# Altium footprint library Connectors.PcbLib: 117 footprints (part 5 of 8)
Each footprint in its own frame and in the unit in brackets; x right, y up, seen from the top. Pads: shape width x height; smd on the part's side, far side on the other; paste and mask are expansions set on the pad; w line width, h text height; cw(c..) or ccw(c..) is an arc to the next point about the centre after c.
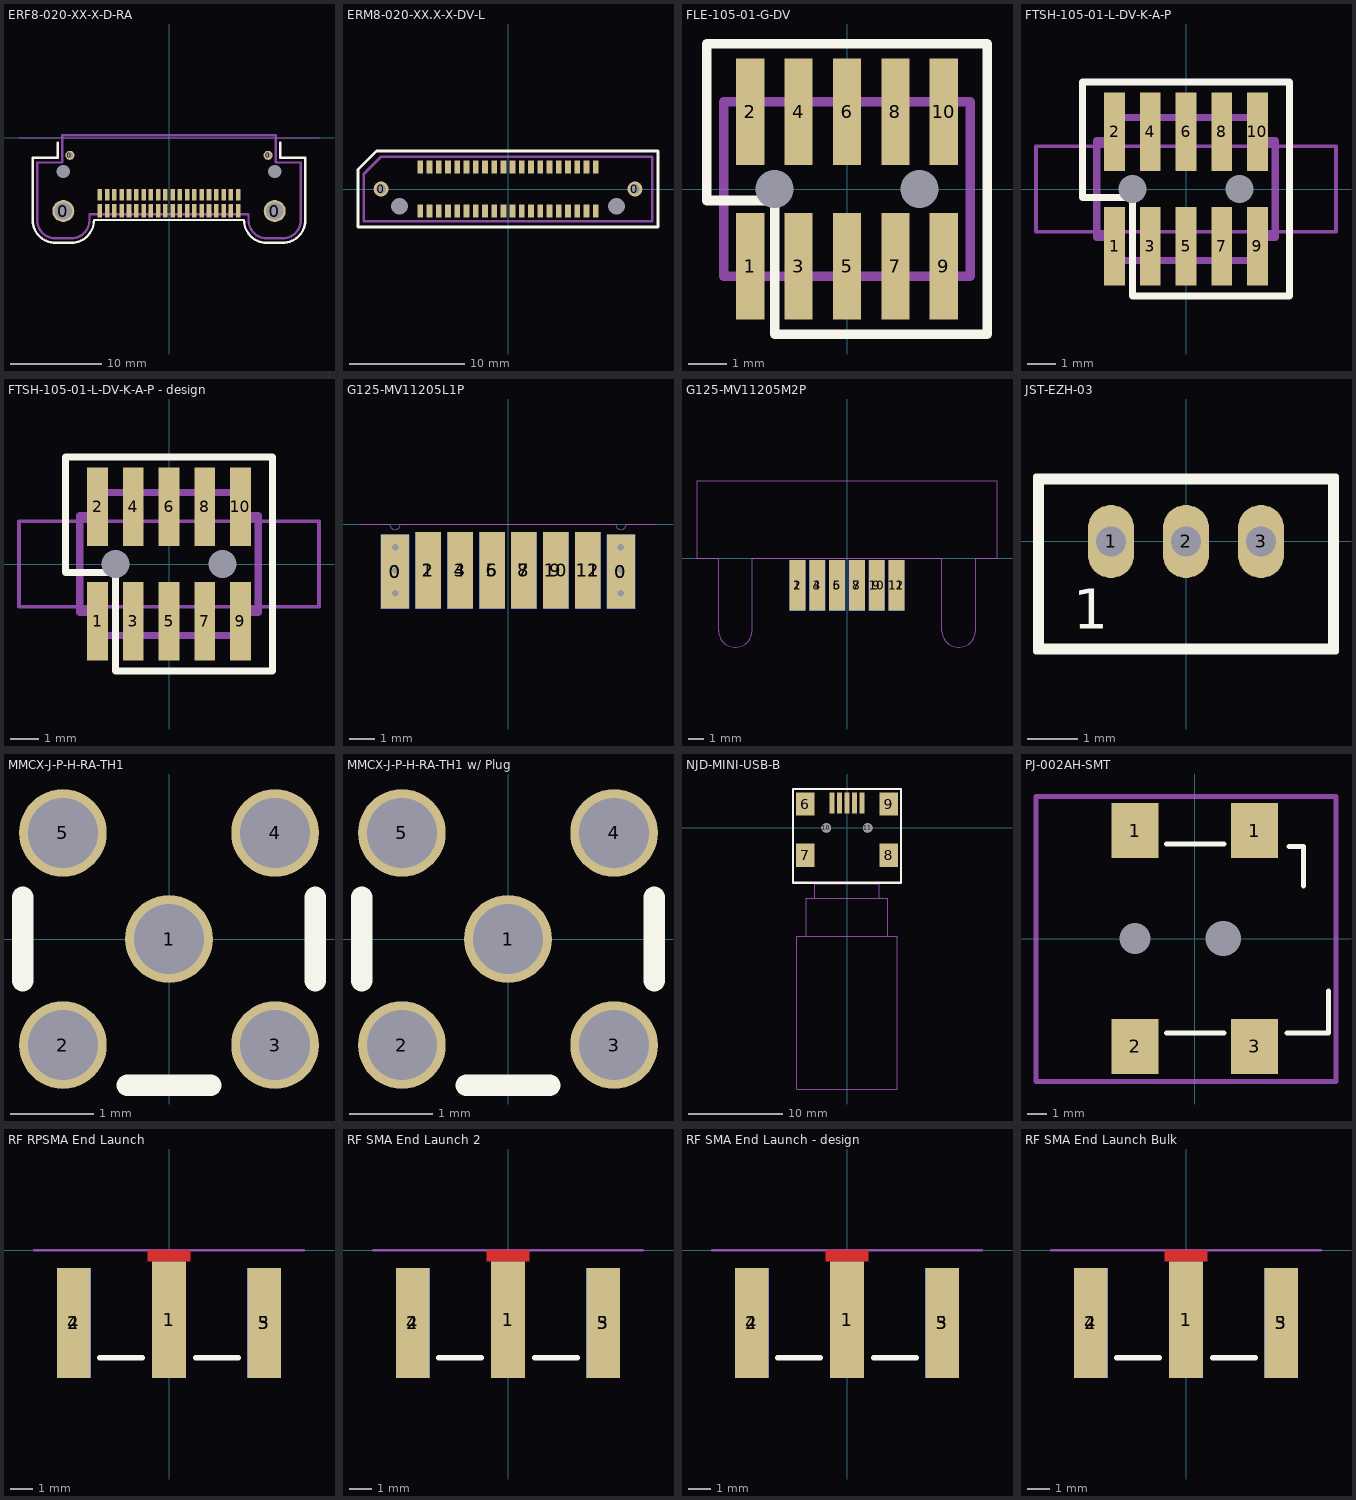
[diagram p4: the footprints below, top view; thin cyan lines are the x and y axes]

## ERF8-020-XX-X-D-RA [mm]
pads (46):
  round 2.41 hole 1.905 mask+0.075: 0(-11.625,-8.05) 0(11.625,-8.05)
  round 1 hole 0.63 mask+0.075: 0(-10.9,-1.92) 0(10.9,-1.92)
  rect 0.5x1.25 smd mask+0.05: 1(7.6,-6.275) 3(6.8,-6.275) 5(6,-6.275) 7(5.2,-6.275) 9(4.4,-6.275) 11(3.6,-6.275) 13(2.8,-6.275) 15(2,-6.275) 17(1.2,-6.275) 19(0.4,-6.275) 21(-0.4,-6.275) 23(-1.2,-6.275) 25(-2,-6.275) 27(-2.8,-6.275) 29(-3.6,-6.275) 31(-4.4,-6.275) 33(-5.2,-6.275) 35(-6,-6.275) 37(-6.8,-6.275) 39(-7.6,-6.275)
  rect 0.5x1.5 smd mask+0.05: 2(7.6,-8.03) 4(6.8,-8.03) 6(6,-8.03) 8(5.2,-8.03) 10(4.4,-8.03) 12(3.6,-8.03) 14(2.8,-8.03) 16(2,-8.03) 18(1.2,-8.03) 20(0.4,-8.03) 22(-0.4,-8.03) 24(-1.2,-8.03) 26(-2,-8.03) 28(-2.8,-8.03) 30(-3.6,-8.03) 32(-4.4,-8.03) 34(-5.2,-8.03) 36(-6,-8.03) 38(-6.8,-8.03) 40(-7.6,-8.03)
  round 0 hole 1.45 unplated: MH1(11.625,-3.7) MH2(-11.625,-3.7)
Top Overlay:
  lines w0.254: -12.25,-0.5 -12.25,-2.2 -15,-2.2 -15,-9.05 ccw(c-12.5,-9.05) -12.5,-11.55 -10.75,-11.55 ; -10.751,-11.55 ccw(c-10.76,-9.04) -8.25,-9.031 ; -8.25,-9.03 8.25,-9.03 ; 8.25,-9.031 ccw(c10.76,-9.04) 10.751,-11.55 ; 10.75,-11.55 12.5,-11.55 ccw(c12.5,-9.05) 15,-9.05 15,-2.2 12.25,-2.2 12.25,-0.5
Mechanical 1:
  lines w0.178: -6.8,-8.4 -6.8,-7.65 ; -6,-8.4 -6,-7.65 ; -5.2,-8.4 -5.2,-7.65 ; -4.4,-8.4 -4.4,-7.65 ; -3.6,-8.4 -3.6,-7.65 ; -2.8,-8.4 -2.8,-7.65 ; -2,-8.4 -2,-7.65 ; -1.2,-8.4 -1.2,-7.65 ; -0.4,-8.4 -0.4,-7.65 ; 0.4,-8.4 0.4,-7.65 ; 1.2,-8.4 1.2,-7.65 ; 2,-8.4 2,-7.65 ; 2.8,-8.4 2.8,-7.65 ; 3.6,-8.4 3.6,-7.65 ; 4.4,-8.4 4.4,-7.65 ; 5.2,-8.4 5.2,-7.65 ; 6,-8.4 6,-7.65 ; 6.8,-8.4 6.8,-7.65 ; -7.6,-8.4 -7.6,-7.65 -7.6,-8.4 ; 7.6,-8.4 7.6,-7.65 7.6,-8.4
  lines w0.254: -14.5,-9.05 ccw(c-12.5,-9.05) -12.5,-11.05 -10.75,-11.05 ccw(c-10.75,-9.05) -8.75,-9.05 -8.75,-8.4 8.75,-8.4 8.75,-9.05 ccw(c10.75,-9.05) 10.75,-11.05 12.5,-11.05 ccw(c12.5,-9.05) 14.5,-9.05 14.5,-2.7 11.75,-2.7 11.75,0.3 -11.75,0.3 -11.75,-2.7 -14.5,-2.7 -14.5,-9.05
Mechanical 16:
  lines w0.03: -16.5,0 16.5,0
3D body "ERF8-020-01-L-D-RA-L-TR.stp": height 6.38, standoff -1.42, extent -14.5,-11.05 14.5,0.3

## ERM8-020-XX.X-X-DV-L [mm]
pads (44):
  round 1.3 hole 0.83 mask+0.075: 0(-11,0) 0(11,0)
  rect 0.5x1.1 smd mask+0.05: 1(-7.6,1.9) 2(-7.6,-1.9) 3(-6.8,1.9) 4(-6.8,-1.9) 5(-6,1.9) 6(-6,-1.9) 7(-5.2,1.9) 8(-5.2,-1.9) 9(-4.4,1.9) 10(-4.4,-1.9) 11(-3.6,1.9) 12(-3.6,-1.9) 13(-2.8,1.9) 14(-2.8,-1.9) 15(-2,1.9) 16(-2,-1.9) 17(-1.2,1.9) 18(-1.2,-1.9) 19(-0.4,1.9) 20(-0.4,-1.9) 21(0.4,1.9) 22(0.4,-1.9) 23(1.2,1.9) 24(1.2,-1.9) 25(2,1.9) 26(2,-1.9) 27(2.8,1.9) 28(2.8,-1.9) 29(3.6,1.9) 30(3.6,-1.9) 31(4.4,1.9) 32(4.4,-1.9) 33(5.2,1.9) 34(5.2,-1.9) 35(6,1.9) 36(6,-1.9) 37(6.8,1.9) 38(6.8,-1.9) 39(7.6,1.9) 40(7.6,-1.9)
  round 0 hole 1.45 unplated: MH1(-9.4,-1.5) MH2(9.4,-1.5)
Top Overlay:
  lines w0.25: -13,-3.3 -13,1.7 -11.4,3.3 13,3.3 13,-3.3 -13,-3.3
Mechanical 1:
  lines w0.25: -12.5,-2.8 -12.5,1.3 -11,2.8 12.5,2.8 12.5,-2.8 -12.5,-2.8
3D body "ERM8-020-05.0-L-DV-L-TR.stp": height 8.79, standoff -1.07, extent -12.5,-2.8 12.5,2.8

## FLE-105-01-G-DV [mil] "Samtec 2x5 1.27mm Socket"
height 172
pads (12):
  rect 29x110 smd mask+2: 1(-100,-80) 2(-100,80) 3(-50,-80) 4(-50,80) 5(0,-80) 6(0,80) 7(50,-80) 8(50,80) 9(100,-80) 10(100,80)
  round 0 hole 38.98 unplated: 11(-75,0) 12(75,0)
Top Overlay:
  lines w10: -145,-11.81 -145,150 145,150 145,-150 -74.8,-150 -74.8,-82.68 -74.8,-11.81 -145,-11.81
Mechanical 13:
  lines w10: -127.5,-90 -127.5,-67.5 -127.5,90 127.5,90 127.5,67.5 127.5,-67.5 127.5,-90 -127.5,-90
3D body "FLE-105-01-G-DV-A.stp": height 179.5, standoff -22.5, extent -127.24,-90.44 127.26,90.46

## FTSH-105-01-L-DV-K-A-P [mil] "Samtec 2x5 1.27mm Header"
pads (12):
  rect 29x110 smd mask+2: 1(-100,-80) 2(-100,80) 3(-50,-80) 4(-50,80) 5(0,-80) 6(0,80) 7(50,-80) 8(50,80) 9(100,-80) 10(100,80)
  round 0 hole 38.98 unplated: 11(-75,0) 12(75,0)
Top Overlay:
  lines w10: -145,-11.81 -145,150 145,150 145,-150 -74.8,-150 -74.8,-82.68 -74.8,-11.81 -145,-11.81
Mechanical 5:
  lines w5: -210,-60.01 209.99,-60.01 209.99,60 -210,60 -210,-60
Mechanical 13:
  lines w10: -125,-67.5 -125,67.5 -100,67.5 -100,100 100,100 100,67.5 125,67.5 125,-67.5 100,-67.5 100,-100 -100,-100 -100,-67.5 -125,-67.5
3D body "FTSH-105-01-L-DV-K-A.stp": height 240.75, standoff -34.25, extent -125,-114.17 125,115.82

## FTSH-105-01-L-DV-K-A-P - design [mil] "Samtec 2x5 1.27mm Header"
pads (12):
  rect 29x110 smd mask+2: 1(-100,-80) 2(-100,80) 3(-50,-80) 4(-50,80) 5(0,-80) 6(0,80) 7(50,-80) 8(50,80) 9(100,-80) 10(100,80)
  round 0 hole 38.98 unplated: 11(-75,0) 12(75,0)
Top Overlay:
  lines w10: -145,-11.81 -145,150 145,150 145,-150 -74.8,-150 -74.8,-82.68 -74.8,-11.81 -145,-11.81
Mechanical 5:
  lines w5: -210,-60.01 209.99,-60.01 209.99,60 -210,60 -210,-60
Mechanical 13:
  lines w10: -125,-67.5 -125,67.5 -100,67.5 -100,100 100,100 100,67.5 125,67.5 125,-67.5 100,-67.5 100,-100 -100,-100 -100,-67.5 -125,-67.5
3D body: height 310, standoff 115, extent -212.5,-62.51 212.49,62.5
3D body "FTSH-105-01-L-DV-K-A.stp": height 240.75, standoff -34.25, extent -124.99,-114.99 125.01,115

## G125-MV11205L1P [mm] "Gecko Male Vertical DIL PC Tail Connector 12 pin"
height 6.5
pads (16):
  rect 1.1x2.9 smd paste-2.54 mask+0: 0(-4.425,-1.85) 0(4.425,-1.85)
  rect 1.1x2.9 smd far side paste-2.54 mask+0: 0(-4.425,-1.85) 0(4.425,-1.85)
  rect 1x3 smd paste-2.54 mask+0: 1(-3.125,-1.8) 3(-1.875,-1.8) 5(-0.625,-1.8) 7(0.625,-1.8) 9(1.875,-1.8) 11(3.125,-1.8)
  rect 1x3 smd far side paste-2.54 mask+0: 2(-3.125,-1.8) 4(-1.875,-1.8) 6(-0.625,-1.8) 8(0.625,-1.8) 10(1.875,-1.8) 12(3.125,-1.8)
via -4.425,-0.9 diameter 0.508 hole 0.254
via -4.425,-1.8 diameter 0.508 hole 0.254
via -4.425,-2.7 diameter 0.508 hole 0.254
via 4.425,-2.7 diameter 0.508 hole 0.254
via 4.425,-1.8 diameter 0.508 hole 0.254
via 4.425,-0.9 diameter 0.508 hole 0.254
Mechanical 13:
  lines w0.013: -5.8,0 -4.625,0 ccw(c-4.425,0) -4.225,0 4.225,0 ccw(c4.425,0) 4.625,0 5.8,0
3D body "g125-mv11205l1_asm.stp": height 2.06, standoff -2.84, extent -5.815,-3.15 5.815,6.65
3D body: height 0.35, standoff 0, extent 0,0 0,0
3D body: height 0.35, standoff 0, extent 0,0 0,0

## G125-MV11205M2P [mm] "Gecko Screw-Lok Male Vertical DIL PC Tail Connector 12 pin"
height 4.9
pads (12):
  rect 1x3.2 smd paste+0 mask+0: 1(-3.125,-1.7) 3(-1.875,-1.7) 5(-0.625,-1.7) 7(0.625,-1.7) 9(1.875,-1.7) 11(3.125,-1.7)
  rect 1x3.2 smd far side paste+0 mask+0: 2(-3.125,-1.7) 4(-1.875,-1.7) 6(-0.625,-1.7) 8(0.625,-1.7) 10(1.875,-1.7) 12(3.125,-1.7)
Mechanical 13:
  lines w0.05: -9.475,0 -9.475,4.9 0,4.9 9.475,4.9 9.475,0 8.1,0 8.1,-4.6 cw(c7.1,-4.6) 7.1,-5.6 7,-5.6 cw(c7,-4.6) 6,-4.6 6,0 -6,0 -6,-4.6 cw(c-7,-4.6) -7,-5.6 -7.1,-5.6 cw(c-7.1,-4.6) -8.1,-4.6 -8.1,0 -9.475,0
3D body "g125-mv11205m2_asm.stp": height 2, standoff -2.9, extent -9.475,-5 9.475,4.9

## JST-EZH-03 [mm]
pads (3):
  oval 0.92x1.46 / inner round 0.92 / far side oval 0.92x1.46 hole 0.61: 1(-1.5,0) 2(0,0) 3(1.5,0)
Top Overlay:
  lines w0.127: -3,-2.2 3,-2.2 3,1.3 -3,1.3 -3,-2.2 ; -2.9,-2.1 2.9,-2.1 2.9,1.2 -2.9,1.2 -2.9,-2.1
  text "1" at -2.25,-1.75 h0.8
Mechanical 1:
  circle w0: c0,0 r0.25
  circle w0: c1.5,0 r0.25
  circle w0: c-1.5,0 r0.25
3D body: height 4.5, standoff 0, extent 2.551,-2.199 2.999,1.299
3D body: height 4.5, standoff 0, extent -2.549,1.001 2.549,1.299
3D body: height 4.5, standoff 0, extent -2.999,-2.199 -2.551,1.299
3D body: height 4.5, standoff 0, extent -2.549,-2.199 2.549,-1.901
3D body: height 4, standoff -2.7, extent 1.251,-0.249 1.749,0.249
3D body: height 4, standoff -2.7, extent -0.249,-0.249 0.249,0.249
3D body: height 4, standoff -2.7, extent -1.749,-0.249 -1.251,0.249
3D body: height 0.5, standoff 0, extent -2.999,-2.199 2.999,1.299

## MMCX-J-P-H-RA-TH1 [mm] "CONN MMCX JACK R/A 50 OHM PCB"
height 3.8
pads (5):
  round 1.05 hole 0.84 paste+0 mask+0: 1(0,0) 2(-1.27,-1.27) 3(1.27,-1.27) 4(1.27,1.27) 5(-1.27,1.27)
Top Overlay:
  lines w0.254: -1.75,-0.5 -1.75,0.5 ; -0.5,-1.75 0.5,-1.75 ; 1.75,-0.5 1.75,0.5
3D body "MMCX-J-P-H-RA-TH1.stp": height 3.81, standoff -2.99, extent -1.752,-1.75 1.751,4.75

## MMCX-J-P-H-RA-TH1 w/ Plug [mm] "CONN MMCX JACK R/A 50 OHM PCB"
height 3.8
pads (5):
  round 1.05 hole 0.84 paste+0 mask+0: 1(0,0) 2(-1.27,-1.27) 3(1.27,-1.27) 4(1.27,1.27) 5(-1.27,1.27)
Top Overlay:
  lines w0.254: -1.75,-0.5 -1.75,0.5 ; -0.5,-1.75 0.5,-1.75 ; 1.75,-0.5 1.75,0.5
3D body "SW3dPS-j0411.STEP": height 3.88, standoff 0.32, extent -1.778,1.981 1.778,14.757
3D body "MMCX-J-P-H-RA-TH1.stp": height 3.81, standoff -2.99, extent -1.752,-1.75 1.751,4.75

## NJD-MINI-USB-B [mm]
pads (11):
  rect 0.5x2.25 smd: 1(-1.6,2.67) 2(-0.8,2.67) 3(0,2.67) 4(0.8,2.67) 5(1.6,2.67)
  rect 2x2.5 smd: 6(-4.45,2.55) 7(-4.45,-2.9) 8(4.45,-2.9) 9(4.45,2.55)
  round 1.016 hole 1.016 unplated: 10(-2.2,0) 11(2.2,0)
Top Overlay:
  lines w0.254: -5.75,-5.85 5.75,-5.85 5.75,4.15 -5.75,4.15 -5.75,-5.85
Mechanical 1:
  lines w0.076: -4.318,-11.557 -4.318,-7.493 -3.429,-7.493 ; -4.318,-11.557 4.318,-11.557 ; -4.318,-11.557 -5.334,-11.557 -5.334,-27.813 5.334,-27.813 5.334,-11.557 4.318,-11.557 ; -3.429,-7.493 3.429,-7.493 ; -3.429,-7.493 -3.429,-5.969 3.429,-5.969 3.429,-7.493 ; 3.429,-7.493 4.318,-7.493 4.318,-11.557
3D body "USB-miniB.STEP": height 4.17, standoff -0.92, extent -4.95,-5.898 4.95,3.302

## PJ-002AH-SMT [mm] "DC Power Jack SMT"
pads (6):
  round 0 hole 1.6 unplated: 0(-3.05,0)
  round 0 hole 1.8 unplated: 0(1.45,0)
  rect 2.4x2.8 smd: 1(-3.05,5.5) 1(3.05,5.5) 2(-3.05,-5.5) 3(3.05,-5.5)
Top Overlay:
  lines w0.254: -1.45,-4.826 1.5,-4.826 ; -1.45,4.826 1.5,4.826 ; 4.7,-4.826 6.81,-4.826 6.81,-2.667 ; 4.8,4.699 5.55,4.699 5.55,2.667
Mechanical 15:
  lines w0.254: -8.1,-7.3 -8.1,7.25 7.2,7.25 7.2,-7.3 -8.1,-7.3
3D body "pj-002ah-smt.stp": height 11, standoff -1.2, extent -8.05,-6.3 6.75,6.3

## RF RPSMA End Launch [mm] "RF RPSMA End Launch Jack"
height 7.92
pads (5):
  rect 1.5x5.2 smd: 1(0,-3.1)
  rect 1.5x4.9 smd: 2(-4.25,-3.25) 3(4.25,-3.25)
  rect 1.5x4.9 smd far side: 4(-4.25,-3.25) 5(4.25,-3.25)
Top Layer:
  pour cut-out: -0.95,-0.5 -0.95,0 0.95,0 0.95,-0.5
Top Overlay:
  lines w0.254: -3.1,-4.8 -1.2,-4.8 ; 1.2,-4.8 3.1,-4.8
Mechanical 13:
  lines w0.127: -6,0 6,0
3D body "132255rp_3d_model.stp": height 4.34, standoff -3.58, extent -4.75,-4.775 4.77,9.775

## RF SMA End Launch 2 [mm] "RF SMA End Launch Jack"
height 7.92
pads (5):
  rect 1.5x5.2 smd: 1(0,-3.1)
  rect 1.5x4.9 smd: 2(-4.25,-3.25) 3(4.25,-3.25)
  rect 1.5x4.9 smd far side: 4(-4.25,-3.25) 5(4.25,-3.25)
Top Layer:
  pour cut-out: -0.95,-0.5 -0.95,0 0.95,0 0.95,-0.5
Top Overlay:
  lines w0.254: -3.1,-4.8 -1.2,-4.8 ; 1.2,-4.8 3.1,-4.8
Mechanical 13:
  lines w0.127: -6,0 6,0
3D body "732511150.stp": height 4.34, standoff -3.58, extent -4.753,-4.74 4.773,9.535

## RF SMA End Launch - design [mm] "RF SMA End Launch Bulkhead Jack"
height 7.92
pads (5):
  rect 1.5x5.2 smd: 1(0,-3.1)
  rect 1.5x4.9 smd: 2(-4.25,-3.25) 3(4.25,-3.25)
  rect 1.5x4.9 smd far side: 4(-4.25,-3.25) 5(4.25,-3.25)
Top Layer:
  pour cut-out: -0.95,-0.5 -0.95,0 0.95,0 0.95,-0.5
Top Overlay:
  lines w0.254: -3.1,-4.8 -1.2,-4.8 ; 1.2,-4.8 3.1,-4.8
Mechanical 13:
  lines w0.127: -6,0 6,0
3D body "User Library-132289_iges_file.step": height 5.49, standoff -4.71, extent -5.1,-4.75 5.1,12.7
3D body "User Library-SMAPLUG-085.step": height 4.44, standoff -3.68, extent -4.318,7.759 4.318,18.478

## RF SMA End Launch Bulk [mm] "RF SMA End Launch Bulkhead Jack"
height 7.92
pads (5):
  rect 1.5x5.2 smd: 1(0,-3.1)
  rect 1.5x4.9 smd: 2(-4.25,-3.25) 3(4.25,-3.25)
  rect 1.5x4.9 smd far side: 4(-4.25,-3.25) 5(4.25,-3.25)
Top Layer:
  pour cut-out: -0.95,-0.5 -0.95,0 0.95,0 0.95,-0.5
Top Overlay:
  lines w0.254: -3.1,-4.8 -1.2,-4.8 ; 1.2,-4.8 3.1,-4.8
Mechanical 13:
  lines w0.127: -6,0 6,0
3D body "User Library-132289_iges_file.step": height 5.49, standoff -4.71, extent -5.1,-4.75 5.1,12.7